# Altium footprint library lib_datalogger.PcbLib: 866 footprints (part 22 of 55)
Each footprint in its own frame and in the unit in brackets; x right, y up, seen from the top. Pads: shape width x height; smd on the part's side, far side on the other; paste and mask are expansions set on the pad; w line width, h text height; cw(c..) or ccw(c..) is an arc to the next point about the centre after c.
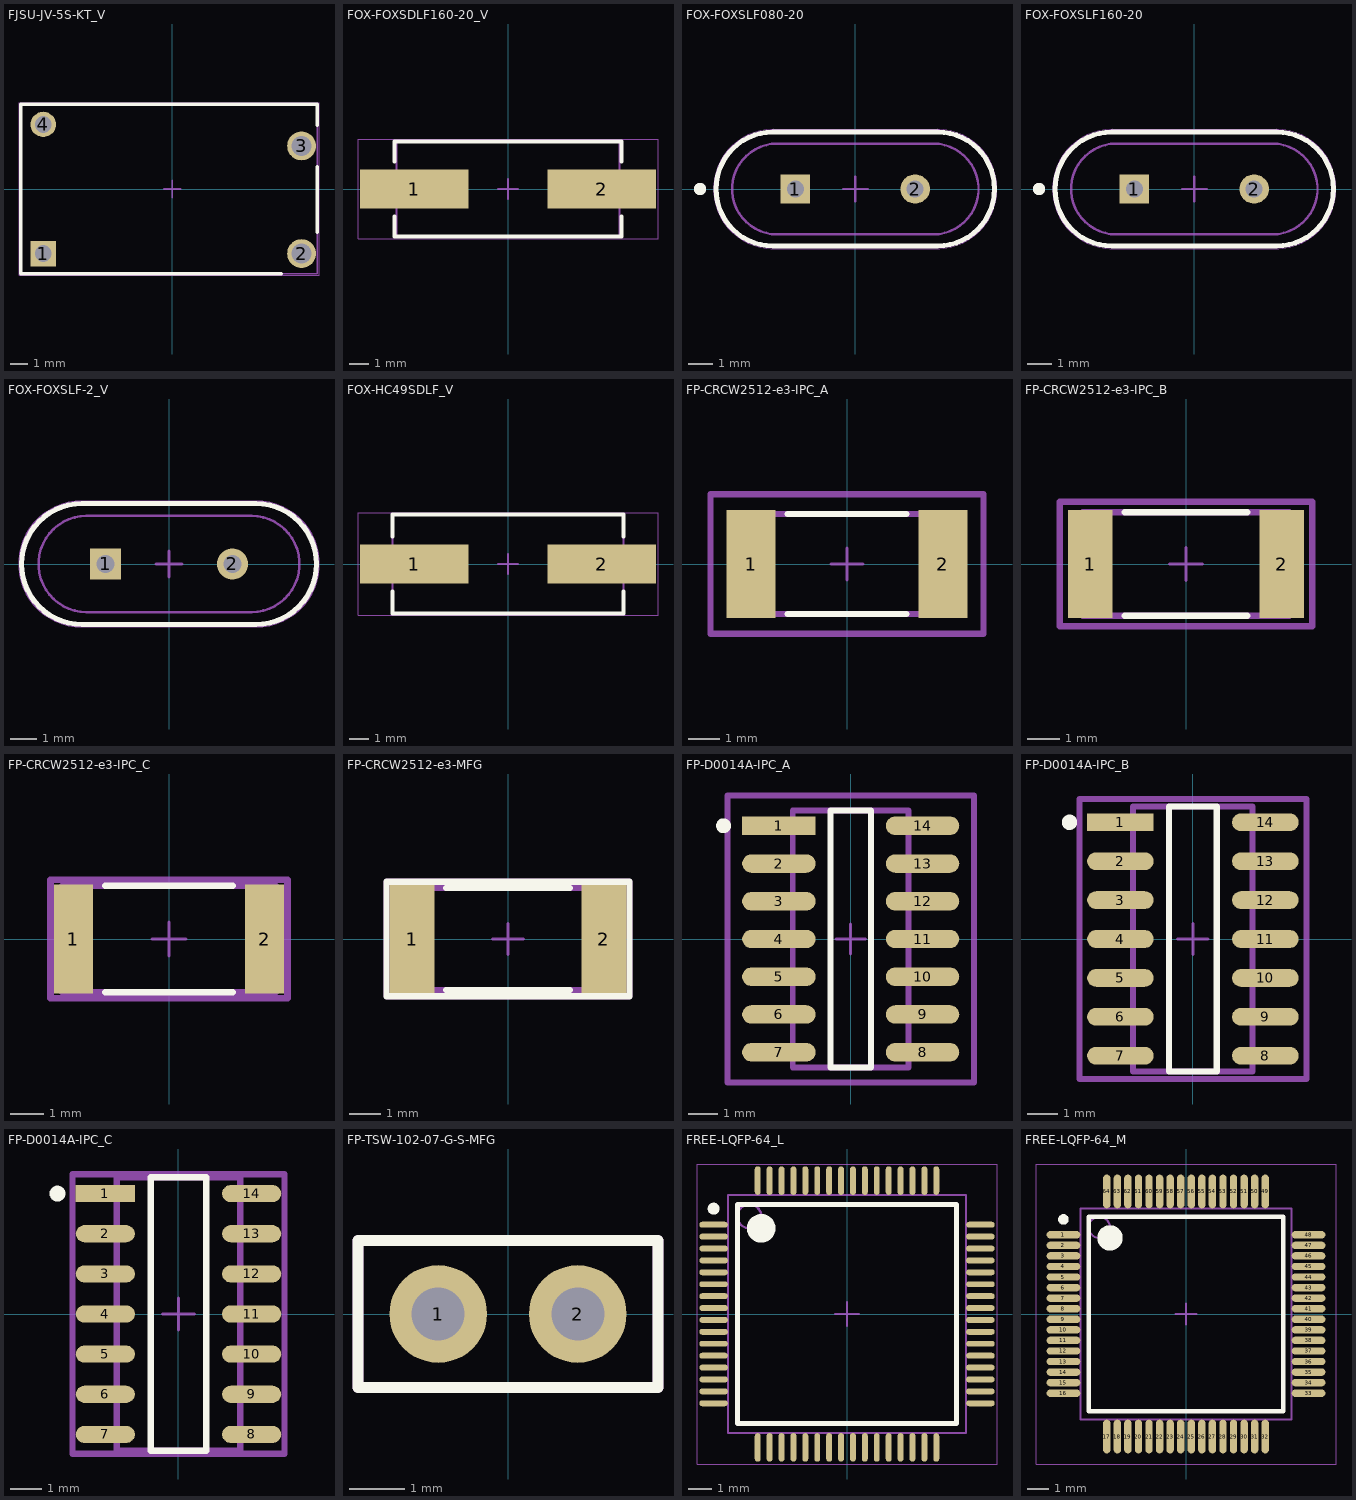
[diagram p21: the footprints below, top view; thin cyan lines are the x and y axes]

## FJSU-JV-5S-KT_V [mm] "THD, 4-Leads, Body 17.5x10mm, Picth 15.24mm"
height 12.8
pads (4):
  rect 1.5x1.5 hole 1: 1(-7.62,-3.81)
  round 1.7 hole 1.2: 2(7.62,-3.81) 3(7.62,2.54)
  round 1.5 hole 1: 4(-7.62,3.81)
Top Overlay:
  lines w0.2: 6.432,-5 -8.95,-5 -8.95,5 8.55,5 8.55,3.769 ; 8.55,-2.567 8.55,1.311
Mechanical 13:
  lines w0.1: -8.95,-5 8.55,-5 8.55,5 -8.95,5 -8.95,-5
Mechanical 15:
  lines w0.05: -9.05,-5.1 8.65,-5.1 8.65,5.1 -9.05,5.1 -9.05,-5.1
  lines w0.1: -0.5,0 0.5,0 ; 0,-0.5 0,0.5
3D body: height 12.8, standoff 0, extent -8.95,-5 8.55,5

## FOX-FOXSDLF160-20_V [mm] "SMD, 2-Leads, Body 5x11.7mm, Height 4.5mm"
height 4.5
pads (2):
  rect 5.5x2 smd: 1(-4.75,0) 2(4.75,0)
Top Overlay:
  lines w0.2: -5.75,-1.4 -5.75,-2.415 5.75,-2.415 5.75,-1.4 ; -5.75,1.4 -5.75,2.415 5.75,2.415 5.75,1.4
Mechanical 13:
  lines w0.1: -5.65,-0.348 -6.6,-0.348 -6.6,0.352 -5.65,0.352 ; 5.65,-0.35 6.6,-0.35 6.6,0.35 5.65,0.35 ; -5.65,-2.415 5.65,-2.415 5.65,2.415 -5.65,2.415 -5.65,-2.415
Mechanical 15:
  lines w0.05: -7.6,-2.515 7.6,-2.515 7.6,2.515 -7.6,2.515 -7.6,-2.515
  lines w0.1: -0.5,0 0.5,0 ; 0,-0.5 0,0.5
3D body: height 0.5, standoff 0, extent -5.65,-2.415 5.65,2.415
3D body: height 4.5, standoff 0.1, extent -5.106,-1.876 5.106,1.876
3D body: height 1, standoff 0, extent -5.55,-2.315 -4.28,-1.045
3D body: height 1, standoff 0, extent 4.282,-2.315 5.552,-1.045
3D body: height 1, standoff 0, extent 4.28,1.047 5.55,2.317
3D body: height 1, standoff 0, extent -5.552,1.045 -4.282,2.315
3D body: height 0.3, standoff 0, extent 5.65,-0.35 6.6,0.35
3D body: height 0.3, standoff 0, extent -6.6,-0.348 -5.65,0.352

## FOX-FOXSLF080-20 [mm] "THD, 2-Leads, Body 11.35x4.65mm"
height 3.6
pads (2):
  rect 1.2x1.2 hole 0.7: 1(-2.44,0)
  round 1.2 hole 0.7: 2(2.44,0)
Top Overlay:
  circle w0.25: c-6.325,0 r0.125
  lines w0.2: -3.35,-2.325 cw(c-3.35,0) -3.35,2.325 3.35,2.325 cw(c3.35,0) 3.35,-2.325 -3.35,-2.325
Mechanical 13:
  lines w0.1: -3.35,-2.325 cw(c-3.35,0) -3.35,2.325 3.35,2.325 cw(c3.35,0) 3.35,-2.325 -3.35,-2.325 ; -3.175,-1.85 cw(c-3.175,0) -3.175,1.85 3.175,1.85 cw(c3.175,0) 3.175,-1.85 -3.175,-1.85
Mechanical 15:
  lines w0.05: -3.45,-2.425 3.45,-2.425 ; -3.45,2.425 3.45,2.425 ; -3.35,-2.425 cw(c-3.35,0) -3.35,2.425 ; 3.35,-2.425 ccw(c3.35,0) 3.35,2.425
  lines w0.1: -0.5,0 0.5,0 ; 0,-0.5 0,0.5
3D body: height 0, standoff -12.7, extent 2.226,-0.214 2.654,0.214
3D body: height 0, standoff -12.7, extent -2.654,-0.214 -2.226,0.214
3D body: height 0.4, standoff 0, extent -5.676,-2.326 5.676,2.326
3D body: height 3.6, standoff 0.4, extent -5.024,-1.849 5.024,1.849

## FOX-FOXSLF160-20 [mm] "THD, 2-Leads, Body 11.35x4.65mm"
height 3.6
pads (2):
  rect 1.2x1.2 hole 0.7: 1(-2.44,0)
  round 1.2 hole 0.7: 2(2.44,0)
Top Overlay:
  circle w0.25: c-6.325,0 r0.125
  lines w0.2: -3.35,-2.325 cw(c-3.35,0) -3.35,2.325 3.35,2.325 cw(c3.35,0) 3.35,-2.325 -3.35,-2.325
Mechanical 13:
  lines w0.1: -3.35,-2.325 cw(c-3.35,0) -3.35,2.325 3.35,2.325 cw(c3.35,0) 3.35,-2.325 -3.35,-2.325 ; -3.175,-1.85 cw(c-3.175,0) -3.175,1.85 3.175,1.85 cw(c3.175,0) 3.175,-1.85 -3.175,-1.85
Mechanical 15:
  lines w0.05: -3.45,-2.425 3.45,-2.425 ; -3.45,2.425 3.45,2.425 ; -3.35,-2.425 cw(c-3.35,0) -3.35,2.425 ; 3.35,-2.425 ccw(c3.35,0) 3.35,2.425
  lines w0.1: -0.5,0 0.5,0 ; 0,-0.5 0,0.5
3D body: height 0, standoff -12.7, extent 2.226,-0.214 2.654,0.214
3D body: height 0, standoff -12.7, extent -2.654,-0.214 -2.226,0.214
3D body: height 0.4, standoff 0, extent -5.676,-2.326 5.676,2.326
3D body: height 3.6, standoff 0.4, extent -5.024,-1.849 5.024,1.849

## FOX-FOXSLF-2_V [mm] "THD, 2-Leads, Body 11.35x4.65mm, Pitch 4.88mm"
height 3.6
pads (2):
  rect 1.2x1.2 hole 0.7: 1(-2.44,0)
  round 1.2 hole 0.7: 2(2.44,0)
Top Overlay:
  lines w0.2: -3.35,-2.325 cw(c-3.35,0) -3.35,2.325 3.35,2.325 cw(c3.35,0) 3.35,-2.325 -3.35,-2.325
Mechanical 13:
  lines w0.1: -3.35,-2.325 cw(c-3.35,0) -3.35,2.325 3.35,2.325 cw(c3.35,0) 3.35,-2.325 -3.35,-2.325 ; -3.175,-1.85 cw(c-3.175,0) -3.175,1.85 3.175,1.85 cw(c3.175,0) 3.175,-1.85 -3.175,-1.85
Mechanical 15:
  lines w0.05: -3.45,-2.425 3.45,-2.425 ; -3.45,2.425 3.45,2.425 ; -3.35,-2.425 cw(c-3.35,0) -3.35,2.425 ; 3.35,-2.425 ccw(c3.35,0) 3.35,2.425
  lines w0.1: -0.5,0 0.5,0 ; 0,-0.5 0,0.5
3D body: height 3.6, standoff 0.4, extent -5.024,-1.849 5.024,1.849
3D body: height 0.4, standoff 0, extent -5.676,-2.326 5.676,2.326
3D body: height 0, standoff -12.7, extent -2.654,-0.214 -2.226,0.214
3D body: height 0, standoff -12.7, extent 2.226,-0.214 2.654,0.214

## FOX-HC49SDLF_V [mm] "SMD, 2-Leads, Body 5x11.7mm"
height 4.5
pads (2):
  rect 5.5x2 smd: 1(-4.75,0) 2(4.75,0)
Top Overlay:
  lines w0.2: -5.85,-1.4 -5.85,-2.5 5.85,-2.5 5.85,-1.4 ; -5.85,1.4 -5.85,2.5 5.85,2.5 5.85,1.4
Mechanical 13:
  lines w0.1: -5.85,-2.5 5.85,-2.5 5.85,2.5 -5.85,2.5 -5.85,-2.5
Mechanical 15:
  lines w0.05: -7.6,-2.6 -7.6,2.6 7.6,2.6 7.6,-2.6 -7.6,-2.6
  lines w0.1: -0.5,0 0.5,0 ; 0,-0.5 0,0.5
3D body "User Library-HC-49S.STEP": height 4.34, standoff -0.01, extent -6.15,-2.35 6.15,2.35

## FP-CRCW2512-e3-IPC_A [mm]
pads (2):
  rect 1.555x3.408 smd paste+0 mask+0: 1(-3.026,0) 2(3.026,0)
Top Overlay:
  lines w0.2: -1.873,-1.575 1.873,-1.575 ; -1.873,1.575 1.873,1.575
Bottom Courtyard:
  lines w0.2: -4.303,-2.204 4.303,-2.204 4.303,2.204 -4.303,2.204 -4.303,-2.204
  text ".Designator" at 0,0.188 h1
Mechanical 13:
  lines w0.2: -3.15,-1.575 3.15,-1.575 3.15,1.575 -3.15,1.575 -3.15,-1.575
Mechanical 15:
  lines w0.2: -4.303,-2.204 4.303,-2.204 4.303,2.204 -4.303,2.204 -4.303,-2.204
Mechanical 16:
  lines w0.1: -0.5,0 0.5,0 ; 0,-0.5 0,0.5
3D body "Res_Vishay_CRCW25121K80FKEG_eec.STEP": height 0.25, standoff 0, extent -4.303,-2.204 4.303,2.204

## FP-CRCW2512-e3-IPC_B [mm]
pads (2):
  rect 1.355x3.308 smd paste+0 mask+0: 1(-2.926,0) 2(2.926,0)
Top Overlay:
  lines w0.2: -1.873,-1.575 1.873,-1.575 ; -1.873,1.575 1.873,1.575
Bottom Courtyard:
  lines w0.2: -3.853,-1.904 3.853,-1.904 3.853,1.904 -3.853,1.904 -3.853,-1.904
  text ".Designator" at 0,0.188 h1
Mechanical 13:
  lines w0.2: -3.15,-1.575 3.15,-1.575 3.15,1.575 -3.15,1.575 -3.15,-1.575
Mechanical 15:
  lines w0.2: -3.853,-1.904 3.853,-1.904 3.853,1.904 -3.853,1.904 -3.853,-1.904
Mechanical 16:
  lines w0.1: -0.5,0 0.5,0 ; 0,-0.5 0,0.5
3D body "Res_Vishay_CRCW25121K80FKEG_eec.STEP": height 0.25, standoff 0, extent -3.853,-1.904 3.853,1.904

## FP-CRCW2512-e3-IPC_C [mm]
pads (2):
  rect 1.155x3.208 smd paste+0 mask+0: 1(-2.826,0) 2(2.826,0)
Top Overlay:
  lines w0.2: -1.873,-1.575 1.873,-1.575 ; -1.873,1.575 1.873,1.575
Bottom Courtyard:
  lines w0.2: -3.503,-1.75 3.503,-1.75 3.503,1.75 -3.503,1.75 -3.503,-1.75
  text ".Designator" at 0,0.188 h1
Mechanical 13:
  lines w0.2: -3.15,-1.575 3.15,-1.575 3.15,1.575 -3.15,1.575 -3.15,-1.575
Mechanical 15:
  lines w0.2: -3.503,-1.75 3.503,-1.75 3.503,1.75 -3.503,1.75 -3.503,-1.75
Mechanical 16:
  lines w0.1: -0.5,0 0.5,0 ; 0,-0.5 0,0.5
3D body "Res_Vishay_CRCW25121K80FKEG_eec.STEP": height 0.25, standoff 0, extent -3.503,-1.75 3.503,1.75

## FP-CRCW2512-e3-MFG [mm]
pads (2):
  rect 1.45x3.5 smd paste+0 mask+0: 1(-3.1,0) 2(3.1,0)
Top Overlay:
  lines w0.2: -2,-1.65 2,-1.65 ; -2,1.65 2,1.65 ; -3.925,-1.85 -3.925,1.85 3.925,1.85 3.925,-1.85 -3.925,-1.85
  text ".Designator" at 4.765,-2.159 h1
Mechanical 13:
  lines w0.2: -3.25,-1.65 -3.25,1.65 3.25,1.65 3.25,-1.65 -3.25,-1.65
Mechanical 15:
  lines w0.2: -3.925,-1.85 -3.925,1.85 3.925,1.85 3.925,-1.85 -3.925,-1.85
Mechanical 16:
  lines w0.1: -0.5,0 0.5,0 ; 0,-0.5 0,0.5
3D body "Res_Vishay_CRCW25121K80FKEG_eec.STEP": height 0.25, standoff 0, extent -3.925,-1.85 3.925,1.85

## FP-D0014A-IPC_A [mm]
pads (14):
  rect 2.474x0.622 smd paste+0 mask+0: 1(-2.416,3.81)
  rrect100% 2.474x0.622 smd paste+0 mask+0: 2(-2.416,2.54) 3(-2.416,1.27) 4(-2.416,0) 5(-2.416,-1.27) 6(-2.416,-2.54) 7(-2.416,-3.81) 8(2.416,-3.81) 9(2.416,-2.54) 10(2.416,-1.27) 11(2.416,0) 12(2.416,1.27) 13(2.416,2.54) 14(2.416,3.81)
Top Overlay:
  circle w0.25: c-4.278,3.81 r0.125
  lines w0.2: -0.679,-4.325 0.679,-4.325 0.679,4.325 -0.679,4.325 -0.679,-4.325
Bottom Courtyard:
  lines w0.2: -4.153,-4.825 4.153,-4.825 4.153,4.825 -4.153,4.825 -4.153,-4.825
  text ".Designator" at 0,0.188 h1
Mechanical 13:
  lines w0.2: -1.95,-4.325 1.95,-4.325 1.95,4.325 -1.95,4.325 -1.95,-4.325
Mechanical 15:
  lines w0.2: -4.153,-4.825 4.153,-4.825 4.153,4.825 -4.153,4.825 -4.153,-4.825
Mechanical 16:
  lines w0.1: -0.5,0 0.5,0 ; 0,-0.5 0,0.5
3D body "IC_Texas_Instruments_LM339DR_eec.STEP": height 0.25, standoff 0, extent -4.153,-4.825 4.153,4.825

## FP-D0014A-IPC_B [mm]
pads (14):
  rect 2.174x0.582 smd paste+0 mask+0: 1(-2.366,3.81)
  rrect100% 2.174x0.582 smd paste+0 mask+0: 2(-2.366,2.54) 3(-2.366,1.27) 4(-2.366,0) 5(-2.366,-1.27) 6(-2.366,-2.54) 7(-2.366,-3.81) 8(2.366,-3.81) 9(2.366,-2.54) 10(2.366,-1.27) 11(2.366,0) 12(2.366,1.27) 13(2.366,2.54) 14(2.366,3.81)
Top Overlay:
  circle w0.25: c-4.028,3.81 r0.125
  lines w0.2: -0.779,-4.325 0.779,-4.325 0.779,4.325 -0.779,4.325 -0.779,-4.325
Bottom Courtyard:
  lines w0.2: -3.703,-4.575 3.703,-4.575 3.703,4.575 -3.703,4.575 -3.703,-4.575
  text ".Designator" at 0,0.188 h1
Mechanical 13:
  lines w0.2: -1.95,-4.325 1.95,-4.325 1.95,4.325 -1.95,4.325 -1.95,-4.325
Mechanical 15:
  lines w0.2: -3.703,-4.575 3.703,-4.575 3.703,4.575 -3.703,4.575 -3.703,-4.575
Mechanical 16:
  lines w0.1: -0.5,0 0.5,0 ; 0,-0.5 0,0.5
3D body "IC_Texas_Instruments_LM339DR_eec.STEP": height 0.25, standoff 0, extent -3.703,-4.575 3.703,4.575

## FP-D0014A-IPC_C [mm]
pads (14):
  rect 1.874x0.542 smd paste+0 mask+0: 1(-2.316,3.81)
  rrect100% 1.874x0.542 smd paste+0 mask+0: 2(-2.316,2.54) 3(-2.316,1.27) 4(-2.316,0) 5(-2.316,-1.27) 6(-2.316,-2.54) 7(-2.316,-3.81) 8(2.316,-3.81) 9(2.316,-2.54) 10(2.316,-1.27) 11(2.316,0) 12(2.316,1.27) 13(2.316,2.54) 14(2.316,3.81)
Top Overlay:
  circle w0.25: c-3.828,3.81 r0.125
  lines w0.2: -0.879,-4.325 0.879,-4.325 0.879,4.325 -0.879,4.325 -0.879,-4.325
Bottom Courtyard:
  lines w0.2: -3.353,-4.425 3.353,-4.425 3.353,4.425 -3.353,4.425 -3.353,-4.425
  text ".Designator" at 0,0.188 h1
Mechanical 13:
  lines w0.2: -1.95,-4.325 1.95,-4.325 1.95,4.325 -1.95,4.325 -1.95,-4.325
Mechanical 15:
  lines w0.2: -3.353,-4.425 3.353,-4.425 3.353,4.425 -3.353,4.425 -3.353,-4.425
Mechanical 16:
  lines w0.1: -0.5,0 0.5,0 ; 0,-0.5 0,0.5
3D body "IC_Texas_Instruments_LM339DR_eec.STEP": height 0.25, standoff 0, extent -3.353,-4.425 3.353,4.425

## FP-TSW-102-07-G-S-MFG [mil]
pads (2):
  round 70 hole 38 paste-39370.1 mask+0: 1(-50,0) 2(50,0)
Top Overlay:
  lines w7.87: -107.48,-52.56 107.48,-52.56 107.48,52.56 -107.48,52.56 -107.48,-52.56
Mechanical 13:
  lines w7.87: -107.48,-52.56 107.48,-52.56 107.48,52.56 -107.48,52.56 -107.48,-52.56
3D body "Conn_Samtec_TSW-102-07-G-S_eec.STEP": height 10, standoff 0, extent -111.42,-56.5 111.42,56.5

## FREE-LQFP-64_L [mm] "TSQFP, 64-Leads, Body 10.00x10.00mm, Pitch 0.50mm, IPC High Density"
height 1.58
pads (64):
  oval 1.2x0.25 smd: 1(-5.6,3.75) 2(-5.6,3.25) 3(-5.6,2.75) 4(-5.6,2.25) 5(-5.6,1.75) 6(-5.6,1.25) 7(-5.6,0.75) 8(-5.6,0.25) 9(-5.6,-0.25) 10(-5.6,-0.75) 11(-5.6,-1.25) 12(-5.6,-1.75) 13(-5.6,-2.25) 14(-5.6,-2.75) 15(-5.6,-3.25) 16(-5.6,-3.75) 33(5.6,-3.75) 34(5.6,-3.25) 35(5.6,-2.75) 36(5.6,-2.25) 37(5.6,-1.75) 38(5.6,-1.25) 39(5.6,-0.75) 40(5.6,-0.25) 41(5.6,0.25) 42(5.6,0.75) 43(5.6,1.25) 44(5.6,1.75) 45(5.6,2.25) 46(5.6,2.75) 47(5.6,3.25) 48(5.6,3.75)
  oval 0.25x1.2 smd: 17(-3.75,-5.6) 18(-3.25,-5.6) 19(-2.75,-5.6) 20(-2.25,-5.6) 21(-1.75,-5.6) 22(-1.25,-5.6) 23(-0.75,-5.6) 24(-0.25,-5.6) 25(0.25,-5.6) 26(0.75,-5.6) 27(1.25,-5.6) 28(1.75,-5.6) 29(2.25,-5.6) 30(2.75,-5.6) 31(3.25,-5.6) 32(3.75,-5.6) 49(3.75,5.6) 50(3.25,5.6) 51(2.75,5.6) 52(2.25,5.6) 53(1.75,5.6) 54(1.25,5.6) 55(0.75,5.6) 56(0.25,5.6) 57(-0.25,5.6) 58(-0.75,5.6) 59(-1.25,5.6) 60(-1.75,5.6) 61(-2.25,5.6) 62(-2.75,5.6) 63(-3.25,5.6) 64(-3.75,5.6)
Top Overlay:
  circle w0.6: c-3.6,3.6 r0.3
  circle w0.25: c-5.6,4.425 r0.125
  lines w0.2: -4.6,-4.6 4.6,-4.6 4.6,4.6 -4.6,4.6 -4.6,-4.6
Mechanical 13:
  circle w0.1: c-4.1,4.1 r0.5
  lines w0.1: -5,-5 5,-5 5,5 -5,5 -5,-5
Mechanical 15:
  lines w0.05: -6.3,-6.3 6.3,-6.3 6.3,6.3 -6.3,6.3 -6.3,-6.3
  lines w0.1: -0.5,0 0.5,0 ; 0,-0.5 0,0.5
3D body "TSQFP50P1200X1200X157-64L.step": height 1.57, standoff 0, extent -6,-6 6,6

## FREE-LQFP-64_M [mm] "TSQFP, 64-Leads, Body 10.00x10.00mm, Pitch 0.50mm, IPC Low Density"
height 1.58
pads (64):
  oval 1.6x0.35 smd: 1(-5.8,3.75) 2(-5.8,3.25) 3(-5.8,2.75) 4(-5.8,2.25) 5(-5.8,1.75) 6(-5.8,1.25) 7(-5.8,0.75) 8(-5.8,0.25) 9(-5.8,-0.25) 10(-5.8,-0.75) 11(-5.8,-1.25) 12(-5.8,-1.75) 13(-5.8,-2.25) 14(-5.8,-2.75) 15(-5.8,-3.25) 16(-5.8,-3.75) 33(5.8,-3.75) 34(5.8,-3.25) 35(5.8,-2.75) 36(5.8,-2.25) 37(5.8,-1.75) 38(5.8,-1.25) 39(5.8,-0.75) 40(5.8,-0.25) 41(5.8,0.25) 42(5.8,0.75) 43(5.8,1.25) 44(5.8,1.75) 45(5.8,2.25) 46(5.8,2.75) 47(5.8,3.25) 48(5.8,3.75)
  oval 0.35x1.6 smd: 17(-3.75,-5.8) 18(-3.25,-5.8) 19(-2.75,-5.8) 20(-2.25,-5.8) 21(-1.75,-5.8) 22(-1.25,-5.8) 23(-0.75,-5.8) 24(-0.25,-5.8) 25(0.25,-5.8) 26(0.75,-5.8) 27(1.25,-5.8) 28(1.75,-5.8) 29(2.25,-5.8) 30(2.75,-5.8) 31(3.25,-5.8) 32(3.75,-5.8) 49(3.75,5.8) 50(3.25,5.8) 51(2.75,5.8) 52(2.25,5.8) 53(1.75,5.8) 54(1.25,5.8) 55(0.75,5.8) 56(0.25,5.8) 57(-0.25,5.8) 58(-0.75,5.8) 59(-1.25,5.8) 60(-1.75,5.8) 61(-2.25,5.8) 62(-2.75,5.8) 63(-3.25,5.8) 64(-3.75,5.8)
Top Overlay:
  circle w0.6: c-3.6,3.6 r0.3
  circle w0.25: c-5.8,4.475 r0.125
  lines w0.2: -4.6,-4.6 4.6,-4.6 4.6,4.6 -4.6,4.6 -4.6,-4.6
Mechanical 13:
  circle w0.1: c-4.1,4.1 r0.5
  lines w0.1: -5,-5 5,-5 5,5 -5,5 -5,-5
Mechanical 15:
  lines w0.05: -7.1,-7.1 7.1,-7.1 7.1,7.1 -7.1,7.1 -7.1,-7.1
  lines w0.1: -0.5,0 0.5,0 ; 0,-0.5 0,0.5
3D body "TSQFP50P1200X1200X157-64M.step": height 1.57, standoff 0, extent -6,-6 6,6